# Altium footprint library Isengard.PcbLib: 145 footprints (part 10 of 10)
Each footprint in its own frame and in the unit in brackets; x right, y up, seen from the top. Pads: shape width x height; smd on the part's side, far side on the other; paste and mask are expansions set on the pad; w line width, h text height; cw(c..) or ccw(c..) is an arc to the next point about the centre after c.
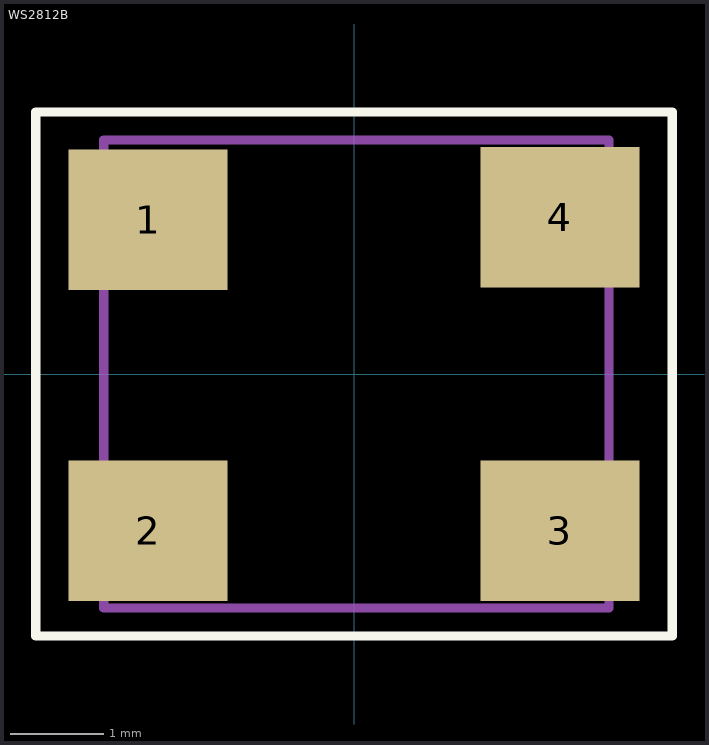
[diagram p9: the footprint, top view; thin cyan lines are the x and y axes]

## WS2812B [mm] "Светодиод SMD RGB с пиксельной адресацией"
pads (4):
  rect 1.7x1.5 smd: 1(-2.2,1.65) 2(-2.2,-1.675) 3(2.2,-1.675) 4(2.2,1.675)
Top Overlay:
  lines w0.1: -3.4,-2.8 -3.4,2.8 3.4,2.8 3.4,-2.8 -3.4,-2.8
Mechanical 7:
  lines w0.1: -2.675,-2.5 -2.675,2.5 2.725,2.5 2.725,-2.5 -2.675,-2.5
3D body "User Library-WS2812B.step": height 1.7, standoff 0, extent -2.675,-2.5 2.725,2.5